# Altium footprint library HSD_connectors.PcbLib: 59 footprints (part 7 of 7)
Each footprint in its own frame and in the unit in brackets; x right, y up, seen from the top. Pads: shape width x height; smd on the part's side, far side on the other; paste and mask are expansions set on the pad; w line width, h text height; cw(c..) or ccw(c..) is an arc to the next point about the centre after c.
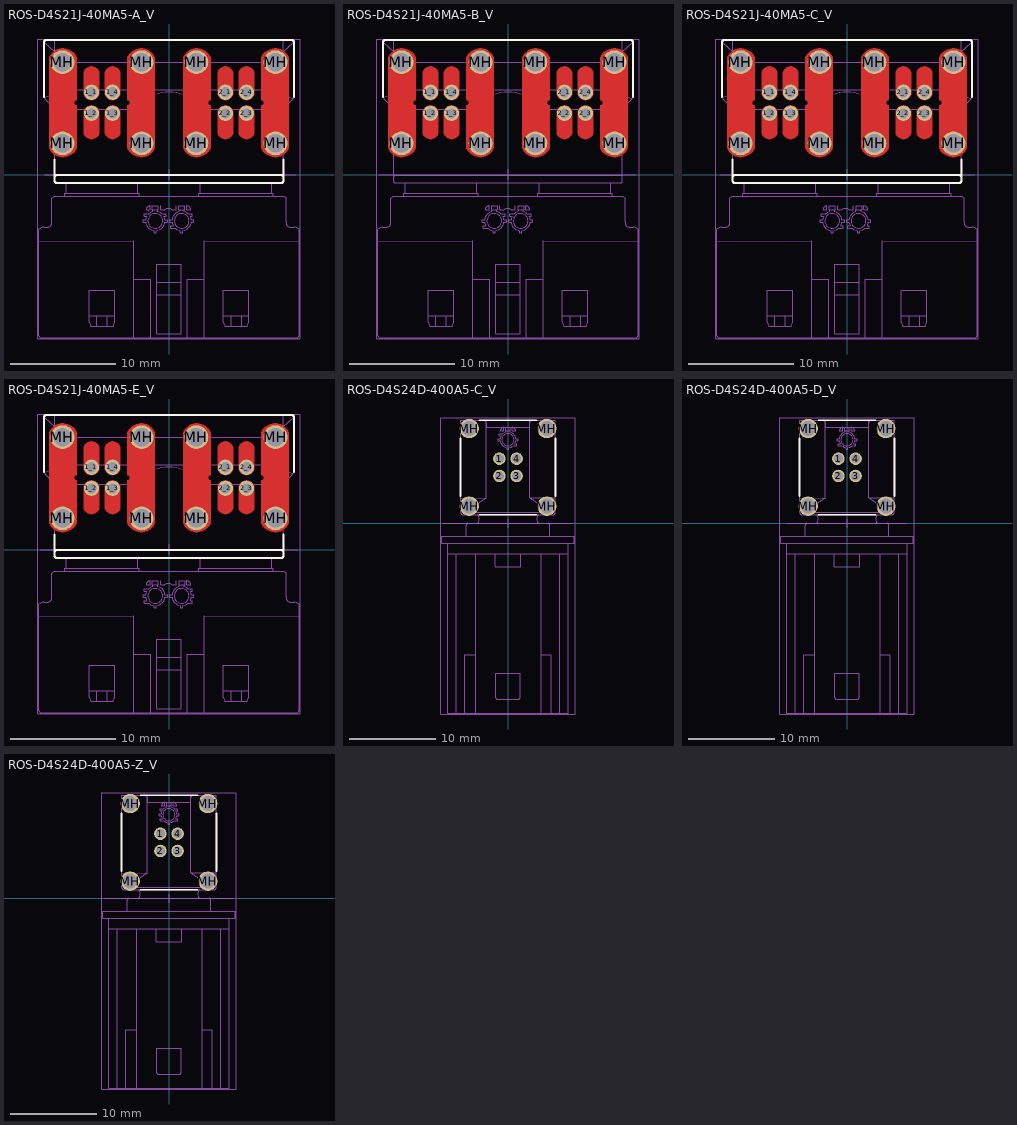
[diagram p6: the footprints below, top view; thin cyan lines are the x and y axes]

## ROS-D4S21J-40MA5-A_V [mm] "Dual HSD, Right Angle Plug, Edge Mount Pin in Paste, 28.25x24.7x7.95mm, Rosenberger Recommended"
height 7.95
pads (16):
  round 1.45 hole 0.95: 1_1(-7.35,7.81) 1_2(-7.35,5.81) 1_3(-5.35,5.81) 1_4(-5.35,7.81) 2_1(5.35,7.81) 2_2(5.35,5.81) 2_3(7.35,5.81) 2_4(7.35,7.81)
  round 2.25 hole 1.75: MH(-10.1,2.96) MH(-10.1,10.66) MH(-2.6,2.96) MH(-2.6,10.66) MH(2.6,2.96) MH(2.6,10.66) MH(10.1,2.96) MH(10.1,10.66)
Top Layer:
  region: -10.1,11.975 -9.995,11.975 -9.786,11.945 -9.584,11.887 -9.392,11.801 -9.214,11.689 -9.053,11.553 -8.913,11.396 -8.796,11.221 -8.75,11.126 -8.75,7.05 -8.797,7.045 -8.883,7.01 -8.95,6.943 -8.985,6.857 -8.99,6.81 -10.1,6.81
  region: -11.35,6.81 -10.1,6.81 -10.1,1.645 -10.2,1.649 -10.396,1.683 -10.586,1.745 -10.765,1.833 -10.93,1.945 -11.078,2.08 -11.205,2.233 -11.31,2.403 -11.35,2.494
  region: -10.1,1.645 -9.995,1.645 -9.786,1.675 -9.584,1.733 -9.392,1.819 -9.214,1.931 -9.053,2.067 -8.913,2.224 -8.796,2.399 -8.75,2.494 -8.75,6.57 -8.797,6.575 -8.883,6.61 -8.95,6.677 -8.985,6.763 -8.99,6.81 -10.1,6.81
  region: -8.1,4.11 -8.1,4.036 -8.071,3.891 -8.015,3.755 -7.933,3.632 -7.828,3.527 -7.705,3.445 -7.569,3.389 -7.424,3.36 -7.35,3.36 -7.35,6.56 -7.424,6.56 -7.569,6.531 -7.705,6.475 -7.828,6.393 -7.933,6.288 -8.015,6.165 -8.071,6.029 -8.1,5.884 -8.1,5.81
  region: -11.35,6.81 -10.1,6.81 -10.1,11.975 -10.2,11.971 -10.396,11.937 -10.586,11.875 -10.765,11.787 -10.93,11.675 -11.078,11.54 -11.205,11.387 -11.31,11.217 -11.35,11.126
  region: -6.6,4.11 -6.6,4.036 -6.629,3.891 -6.685,3.755 -6.767,3.632 -6.872,3.527 -6.995,3.445 -7.131,3.389 -7.276,3.36 -7.35,3.36 -7.35,6.56 -7.276,6.56 -7.131,6.531 -6.995,6.475 -6.872,6.393 -6.767,6.288 -6.685,6.165 -6.629,6.029 -6.6,5.884 -6.6,5.81
  region: -6.6,9.51 -6.6,9.584 -6.629,9.729 -6.685,9.865 -6.767,9.988 -6.872,10.093 -6.995,10.175 -7.131,10.231 -7.276,10.26 -7.35,10.26 -7.35,7.06 -7.276,7.06 -7.131,7.089 -6.995,7.145 -6.872,7.227 -6.767,7.332 -6.685,7.455 -6.629,7.591 -6.6,7.736 -6.6,7.81
  region: -8.1,9.51 -8.1,9.584 -8.071,9.729 -8.015,9.865 -7.933,9.988 -7.828,10.093 -7.705,10.175 -7.569,10.231 -7.424,10.26 -7.35,10.26 -7.35,7.06 -7.424,7.06 -7.569,7.089 -7.705,7.145 -7.828,7.227 -7.933,7.332 -8.015,7.455 -8.071,7.591 -8.1,7.736 -8.1,7.81
  region: -6.1,9.51 -6.1,9.584 -6.071,9.729 -6.015,9.865 -5.933,9.988 -5.828,10.093 -5.705,10.175 -5.569,10.231 -5.424,10.26 -5.35,10.26 -5.35,7.06 -5.424,7.06 -5.569,7.089 -5.705,7.145 -5.828,7.227 -5.933,7.332 -6.015,7.455 -6.071,7.591 -6.1,7.736 -6.1,7.81
  region: -4.6,9.51 -4.6,9.584 -4.629,9.729 -4.685,9.865 -4.767,9.988 -4.872,10.093 -4.995,10.175 -5.131,10.231 -5.276,10.26 -5.35,10.26 -5.35,7.06 -5.276,7.06 -5.131,7.089 -4.995,7.145 -4.872,7.227 -4.767,7.332 -4.685,7.455 -4.629,7.591 -4.6,7.736 -4.6,7.81
  region: -6.1,4.11 -6.1,4.036 -6.071,3.891 -6.015,3.755 -5.933,3.632 -5.828,3.527 -5.705,3.445 -5.569,3.389 -5.424,3.36 -5.35,3.36 -5.35,6.56 -5.424,6.56 -5.569,6.531 -5.705,6.475 -5.828,6.393 -5.933,6.288 -6.015,6.165 -6.071,6.029 -6.1,5.884 -6.1,5.81
  region: -4.6,4.11 -4.6,4.036 -4.629,3.891 -4.685,3.755 -4.767,3.632 -4.872,3.527 -4.995,3.445 -5.131,3.389 -5.276,3.36 -5.35,3.36 -5.35,6.56 -5.276,6.56 -5.131,6.531 -4.995,6.475 -4.872,6.393 -4.767,6.288 -4.685,6.165 -4.629,6.029 -4.6,5.884 -4.6,5.81
  region: -1.35,6.81 -2.6,6.81 -2.6,11.975 -2.5,11.971 -2.304,11.937 -2.114,11.875 -1.935,11.787 -1.77,11.675 -1.622,11.54 -1.495,11.387 -1.39,11.217 -1.35,11.126
  region: -2.6,1.645 -2.705,1.645 -2.914,1.675 -3.116,1.733 -3.308,1.819 -3.486,1.931 -3.647,2.067 -3.787,2.224 -3.904,2.399 -3.95,2.494 -3.95,6.57 -3.903,6.575 -3.817,6.61 -3.75,6.677 -3.715,6.763 -3.71,6.81 -2.6,6.81
  region: -1.35,6.81 -2.6,6.81 -2.6,1.645 -2.5,1.649 -2.304,1.683 -2.114,1.745 -1.935,1.833 -1.77,1.945 -1.622,2.08 -1.495,2.233 -1.39,2.403 -1.35,2.494
  region: -2.6,11.975 -2.705,11.975 -2.914,11.945 -3.116,11.887 -3.308,11.801 -3.486,11.689 -3.647,11.553 -3.787,11.396 -3.904,11.221 -3.95,11.126 -3.95,7.05 -3.903,7.045 -3.817,7.01 -3.75,6.943 -3.715,6.857 -3.71,6.81 -2.6,6.81
  region: 2.6,11.975 2.705,11.975 2.914,11.945 3.116,11.887 3.308,11.801 3.486,11.689 3.647,11.553 3.787,11.396 3.904,11.221 3.95,11.126 3.95,7.05 3.903,7.045 3.817,7.01 3.75,6.943 3.715,6.857 3.71,6.81 2.6,6.81
  region: 1.35,6.81 2.6,6.81 2.6,1.645 2.5,1.649 2.304,1.683 2.114,1.745 1.935,1.833 1.77,1.945 1.622,2.08 1.495,2.233 1.39,2.403 1.35,2.494
  region: 2.6,1.645 2.705,1.645 2.914,1.675 3.116,1.733 3.308,1.819 3.486,1.931 3.647,2.067 3.787,2.224 3.904,2.399 3.95,2.494 3.95,6.57 3.903,6.575 3.817,6.61 3.75,6.677 3.715,6.763 3.71,6.81 2.6,6.81
  region: 1.35,6.81 2.6,6.81 2.6,11.975 2.5,11.971 2.304,11.937 2.114,11.875 1.935,11.787 1.77,11.675 1.622,11.54 1.495,11.387 1.39,11.217 1.35,11.126
  region: 4.6,4.11 4.6,4.036 4.629,3.891 4.685,3.755 4.767,3.632 4.872,3.527 4.995,3.445 5.131,3.389 5.276,3.36 5.35,3.36 5.35,6.56 5.276,6.56 5.131,6.531 4.995,6.475 4.872,6.393 4.767,6.288 4.685,6.165 4.629,6.029 4.6,5.884 4.6,5.81
  region: 6.1,4.11 6.1,4.036 6.071,3.891 6.015,3.755 5.933,3.632 5.828,3.527 5.705,3.445 5.569,3.389 5.424,3.36 5.35,3.36 5.35,6.56 5.424,6.56 5.569,6.531 5.705,6.475 5.828,6.393 5.933,6.288 6.015,6.165 6.071,6.029 6.1,5.884 6.1,5.81
  region: 4.6,9.51 4.6,9.584 4.629,9.729 4.685,9.865 4.767,9.988 4.872,10.093 4.995,10.175 5.131,10.231 5.276,10.26 5.35,10.26 5.35,7.06 5.276,7.06 5.131,7.089 4.995,7.145 4.872,7.227 4.767,7.332 4.685,7.455 4.629,7.591 4.6,7.736 4.6,7.81
  region: 6.1,9.51 6.1,9.584 6.071,9.729 6.015,9.865 5.933,9.988 5.828,10.093 5.705,10.175 5.569,10.231 5.424,10.26 5.35,10.26 5.35,7.06 5.424,7.06 5.569,7.089 5.705,7.145 5.828,7.227 5.933,7.332 6.015,7.455 6.071,7.591 6.1,7.736 6.1,7.81
  region: 8.1,9.51 8.1,9.584 8.071,9.729 8.015,9.865 7.933,9.988 7.828,10.093 7.705,10.175 7.569,10.231 7.424,10.26 7.35,10.26 7.35,7.06 7.424,7.06 7.569,7.089 7.705,7.145 7.828,7.227 7.933,7.332 8.015,7.455 8.071,7.591 8.1,7.736 8.1,7.81
  region: 6.6,9.51 6.6,9.584 6.629,9.729 6.685,9.865 6.767,9.988 6.872,10.093 6.995,10.175 7.131,10.231 7.276,10.26 7.35,10.26 7.35,7.06 7.276,7.06 7.131,7.089 6.995,7.145 6.872,7.227 6.767,7.332 6.685,7.455 6.629,7.591 6.6,7.736 6.6,7.81
  region: 6.6,4.11 6.6,4.036 6.629,3.891 6.685,3.755 6.767,3.632 6.872,3.527 6.995,3.445 7.131,3.389 7.276,3.36 7.35,3.36 7.35,6.56 7.276,6.56 7.131,6.531 6.995,6.475 6.872,6.393 6.767,6.288 6.685,6.165 6.629,6.029 6.6,5.884 6.6,5.81
  region: 11.35,6.81 10.1,6.81 10.1,11.975 10.2,11.971 10.396,11.937 10.586,11.875 10.765,11.787 10.93,11.675 11.078,11.54 11.205,11.387 11.31,11.217 11.35,11.126
  region: 8.1,4.11 8.1,4.036 8.071,3.891 8.015,3.755 7.933,3.632 7.828,3.527 7.705,3.445 7.569,3.389 7.424,3.36 7.35,3.36 7.35,6.56 7.424,6.56 7.569,6.531 7.705,6.475 7.828,6.393 7.933,6.288 8.015,6.165 8.071,6.029 8.1,5.884 8.1,5.81
  region: 10.1,1.645 9.995,1.645 9.786,1.675 9.584,1.733 9.392,1.819 9.214,1.931 9.053,2.067 8.913,2.224 8.796,2.399 8.75,2.494 8.75,6.57 8.797,6.575 8.883,6.61 8.95,6.677 8.985,6.763 8.99,6.81 10.1,6.81
  region: 11.35,6.81 10.1,6.81 10.1,1.645 10.2,1.649 10.396,1.683 10.586,1.745 10.765,1.833 10.93,1.945 11.078,2.08 11.205,2.233 11.31,2.403 11.35,2.494
  region: 10.1,11.975 9.995,11.975 9.786,11.945 9.584,11.887 9.392,11.801 9.214,11.689 9.053,11.553 8.913,11.396 8.796,11.221 8.75,11.126 8.75,7.05 8.797,7.045 8.883,7.01 8.95,6.943 8.985,6.857 8.99,6.81 10.1,6.81
Top Overlay:
  lines w0.2: -11.85,7.343 -11.85,12.56 cw(c-11.65,12.56) -11.65,12.76 -10.85,12.76 10.85,12.76 11.65,12.76 cw(c11.65,12.56) 11.85,12.56 11.85,7.343 ; -10.85,1.426 -10.85,-0.24 ; 10.85,1.426 10.85,-0.24 ; -10.85,-0.24 cw(c-10.65,-0.24) -10.65,-0.04 10.65,-0.04 cw(c10.65,-0.24) 10.85,-0.24 ; -10.85,-0.24 -10.85,-0.59 ccw(c-10.65,-0.59) -10.65,-0.79 10.65,-0.79 ccw(c10.65,-0.59) 10.85,-0.59 10.85,-0.24
Mechanical 3:
  lines w0.1: -11.8,0 12,0
  text "Board Edge" at -12.2,-0.5 h0.2
Mechanical 13:
  drawing of 192 lines, arcs and shapes, not listed
  text ".Designator" at -2.02,0.17 h2.69
Mechanical 15:
  lines w0.05: -12.45,-15.59 12.45,-15.59 12.45,12.86 -12.45,12.86 -12.45,-15.59
  lines w0.1: -0.5,0 0.5,0 ; 0,-0.5 0,0.5
3D body "d4s21j-40mA5-A.stp": height 11, standoff -3.2, extent -12.35,-15.49 12.35,12.76

## ROS-D4S21J-40MA5-B_V [mm] "Dual HSD, Right Angle Plug, Edge Mount Pin in Paste, 28.25x24.7x7.95mm, Rosenberger Recommended"
height 7.95
pads (16):
  round 1.45 hole 0.95: 1_1(-7.35,7.81) 1_2(-7.35,5.81) 1_3(-5.35,5.81) 1_4(-5.35,7.81) 2_1(5.35,7.81) 2_2(5.35,5.81) 2_3(7.35,5.81) 2_4(7.35,7.81)
  round 2.25 hole 1.75: MH(-10.1,2.96) MH(-10.1,10.66) MH(-2.6,2.96) MH(-2.6,10.66) MH(2.6,2.96) MH(2.6,10.66) MH(10.1,2.96) MH(10.1,10.66)
Top Layer:
  region: 10.1,11.975 9.995,11.975 9.786,11.945 9.584,11.887 9.392,11.801 9.214,11.689 9.053,11.553 8.913,11.396 8.796,11.221 8.75,11.126 8.75,7.05 8.797,7.045 8.883,7.01 8.95,6.943 8.985,6.857 8.99,6.81 10.1,6.81
  region: 11.35,6.81 10.1,6.81 10.1,1.645 10.2,1.649 10.396,1.683 10.586,1.745 10.765,1.833 10.93,1.945 11.078,2.08 11.205,2.233 11.31,2.403 11.35,2.494
  region: 10.1,1.645 9.995,1.645 9.786,1.675 9.584,1.733 9.392,1.819 9.214,1.931 9.053,2.067 8.913,2.224 8.796,2.399 8.75,2.494 8.75,6.57 8.797,6.575 8.883,6.61 8.95,6.677 8.985,6.763 8.99,6.81 10.1,6.81
  region: 8.1,4.11 8.1,4.036 8.071,3.891 8.015,3.755 7.933,3.632 7.828,3.527 7.705,3.445 7.569,3.389 7.424,3.36 7.35,3.36 7.35,6.56 7.424,6.56 7.569,6.531 7.705,6.475 7.828,6.393 7.933,6.288 8.015,6.165 8.071,6.029 8.1,5.884 8.1,5.81
  region: 11.35,6.81 10.1,6.81 10.1,11.975 10.2,11.971 10.396,11.937 10.586,11.875 10.765,11.787 10.93,11.675 11.078,11.54 11.205,11.387 11.31,11.217 11.35,11.126
  region: 6.6,4.11 6.6,4.036 6.629,3.891 6.685,3.755 6.767,3.632 6.872,3.527 6.995,3.445 7.131,3.389 7.276,3.36 7.35,3.36 7.35,6.56 7.276,6.56 7.131,6.531 6.995,6.475 6.872,6.393 6.767,6.288 6.685,6.165 6.629,6.029 6.6,5.884 6.6,5.81
  region: 6.6,9.51 6.6,9.584 6.629,9.729 6.685,9.865 6.767,9.988 6.872,10.093 6.995,10.175 7.131,10.231 7.276,10.26 7.35,10.26 7.35,7.06 7.276,7.06 7.131,7.089 6.995,7.145 6.872,7.227 6.767,7.332 6.685,7.455 6.629,7.591 6.6,7.736 6.6,7.81
  region: 8.1,9.51 8.1,9.584 8.071,9.729 8.015,9.865 7.933,9.988 7.828,10.093 7.705,10.175 7.569,10.231 7.424,10.26 7.35,10.26 7.35,7.06 7.424,7.06 7.569,7.089 7.705,7.145 7.828,7.227 7.933,7.332 8.015,7.455 8.071,7.591 8.1,7.736 8.1,7.81
  region: 6.1,9.51 6.1,9.584 6.071,9.729 6.015,9.865 5.933,9.988 5.828,10.093 5.705,10.175 5.569,10.231 5.424,10.26 5.35,10.26 5.35,7.06 5.424,7.06 5.569,7.089 5.705,7.145 5.828,7.227 5.933,7.332 6.015,7.455 6.071,7.591 6.1,7.736 6.1,7.81
  region: 4.6,9.51 4.6,9.584 4.629,9.729 4.685,9.865 4.767,9.988 4.872,10.093 4.995,10.175 5.131,10.231 5.276,10.26 5.35,10.26 5.35,7.06 5.276,7.06 5.131,7.089 4.995,7.145 4.872,7.227 4.767,7.332 4.685,7.455 4.629,7.591 4.6,7.736 4.6,7.81
  region: 6.1,4.11 6.1,4.036 6.071,3.891 6.015,3.755 5.933,3.632 5.828,3.527 5.705,3.445 5.569,3.389 5.424,3.36 5.35,3.36 5.35,6.56 5.424,6.56 5.569,6.531 5.705,6.475 5.828,6.393 5.933,6.288 6.015,6.165 6.071,6.029 6.1,5.884 6.1,5.81
  region: 4.6,4.11 4.6,4.036 4.629,3.891 4.685,3.755 4.767,3.632 4.872,3.527 4.995,3.445 5.131,3.389 5.276,3.36 5.35,3.36 5.35,6.56 5.276,6.56 5.131,6.531 4.995,6.475 4.872,6.393 4.767,6.288 4.685,6.165 4.629,6.029 4.6,5.884 4.6,5.81
  region: 1.35,6.81 2.6,6.81 2.6,11.975 2.5,11.971 2.304,11.937 2.114,11.875 1.935,11.787 1.77,11.675 1.622,11.54 1.495,11.387 1.39,11.217 1.35,11.126
  region: 2.6,1.645 2.705,1.645 2.914,1.675 3.116,1.733 3.308,1.819 3.486,1.931 3.647,2.067 3.787,2.224 3.904,2.399 3.95,2.494 3.95,6.57 3.903,6.575 3.817,6.61 3.75,6.677 3.715,6.763 3.71,6.81 2.6,6.81
  region: 1.35,6.81 2.6,6.81 2.6,1.645 2.5,1.649 2.304,1.683 2.114,1.745 1.935,1.833 1.77,1.945 1.622,2.08 1.495,2.233 1.39,2.403 1.35,2.494
  region: 2.6,11.975 2.705,11.975 2.914,11.945 3.116,11.887 3.308,11.801 3.486,11.689 3.647,11.553 3.787,11.396 3.904,11.221 3.95,11.126 3.95,7.05 3.903,7.045 3.817,7.01 3.75,6.943 3.715,6.857 3.71,6.81 2.6,6.81
  region: -2.6,11.975 -2.705,11.975 -2.914,11.945 -3.116,11.887 -3.308,11.801 -3.486,11.689 -3.647,11.553 -3.787,11.396 -3.904,11.221 -3.95,11.126 -3.95,7.05 -3.903,7.045 -3.817,7.01 -3.75,6.943 -3.715,6.857 -3.71,6.81 -2.6,6.81
  region: -1.35,6.81 -2.6,6.81 -2.6,1.645 -2.5,1.649 -2.304,1.683 -2.114,1.745 -1.935,1.833 -1.77,1.945 -1.622,2.08 -1.495,2.233 -1.39,2.403 -1.35,2.494
  region: -2.6,1.645 -2.705,1.645 -2.914,1.675 -3.116,1.733 -3.308,1.819 -3.486,1.931 -3.647,2.067 -3.787,2.224 -3.904,2.399 -3.95,2.494 -3.95,6.57 -3.903,6.575 -3.817,6.61 -3.75,6.677 -3.715,6.763 -3.71,6.81 -2.6,6.81
  region: -1.35,6.81 -2.6,6.81 -2.6,11.975 -2.5,11.971 -2.304,11.937 -2.114,11.875 -1.935,11.787 -1.77,11.675 -1.622,11.54 -1.495,11.387 -1.39,11.217 -1.35,11.126
  region: -4.6,4.11 -4.6,4.036 -4.629,3.891 -4.685,3.755 -4.767,3.632 -4.872,3.527 -4.995,3.445 -5.131,3.389 -5.276,3.36 -5.35,3.36 -5.35,6.56 -5.276,6.56 -5.131,6.531 -4.995,6.475 -4.872,6.393 -4.767,6.288 -4.685,6.165 -4.629,6.029 -4.6,5.884 -4.6,5.81
  region: -6.1,4.11 -6.1,4.036 -6.071,3.891 -6.015,3.755 -5.933,3.632 -5.828,3.527 -5.705,3.445 -5.569,3.389 -5.424,3.36 -5.35,3.36 -5.35,6.56 -5.424,6.56 -5.569,6.531 -5.705,6.475 -5.828,6.393 -5.933,6.288 -6.015,6.165 -6.071,6.029 -6.1,5.884 -6.1,5.81
  region: -4.6,9.51 -4.6,9.584 -4.629,9.729 -4.685,9.865 -4.767,9.988 -4.872,10.093 -4.995,10.175 -5.131,10.231 -5.276,10.26 -5.35,10.26 -5.35,7.06 -5.276,7.06 -5.131,7.089 -4.995,7.145 -4.872,7.227 -4.767,7.332 -4.685,7.455 -4.629,7.591 -4.6,7.736 -4.6,7.81
  region: -6.1,9.51 -6.1,9.584 -6.071,9.729 -6.015,9.865 -5.933,9.988 -5.828,10.093 -5.705,10.175 -5.569,10.231 -5.424,10.26 -5.35,10.26 -5.35,7.06 -5.424,7.06 -5.569,7.089 -5.705,7.145 -5.828,7.227 -5.933,7.332 -6.015,7.455 -6.071,7.591 -6.1,7.736 -6.1,7.81
  region: -8.1,9.51 -8.1,9.584 -8.071,9.729 -8.015,9.865 -7.933,9.988 -7.828,10.093 -7.705,10.175 -7.569,10.231 -7.424,10.26 -7.35,10.26 -7.35,7.06 -7.424,7.06 -7.569,7.089 -7.705,7.145 -7.828,7.227 -7.933,7.332 -8.015,7.455 -8.071,7.591 -8.1,7.736 -8.1,7.81
  region: -6.6,9.51 -6.6,9.584 -6.629,9.729 -6.685,9.865 -6.767,9.988 -6.872,10.093 -6.995,10.175 -7.131,10.231 -7.276,10.26 -7.35,10.26 -7.35,7.06 -7.276,7.06 -7.131,7.089 -6.995,7.145 -6.872,7.227 -6.767,7.332 -6.685,7.455 -6.629,7.591 -6.6,7.736 -6.6,7.81
  region: -6.6,4.11 -6.6,4.036 -6.629,3.891 -6.685,3.755 -6.767,3.632 -6.872,3.527 -6.995,3.445 -7.131,3.389 -7.276,3.36 -7.35,3.36 -7.35,6.56 -7.276,6.56 -7.131,6.531 -6.995,6.475 -6.872,6.393 -6.767,6.288 -6.685,6.165 -6.629,6.029 -6.6,5.884 -6.6,5.81
  region: -11.35,6.81 -10.1,6.81 -10.1,11.975 -10.2,11.971 -10.396,11.937 -10.586,11.875 -10.765,11.787 -10.93,11.675 -11.078,11.54 -11.205,11.387 -11.31,11.217 -11.35,11.126
  region: -8.1,4.11 -8.1,4.036 -8.071,3.891 -8.015,3.755 -7.933,3.632 -7.828,3.527 -7.705,3.445 -7.569,3.389 -7.424,3.36 -7.35,3.36 -7.35,6.56 -7.424,6.56 -7.569,6.531 -7.705,6.475 -7.828,6.393 -7.933,6.288 -8.015,6.165 -8.071,6.029 -8.1,5.884 -8.1,5.81
  region: -10.1,1.645 -9.995,1.645 -9.786,1.675 -9.584,1.733 -9.392,1.819 -9.214,1.931 -9.053,2.067 -8.913,2.224 -8.796,2.399 -8.75,2.494 -8.75,6.57 -8.797,6.575 -8.883,6.61 -8.95,6.677 -8.985,6.763 -8.99,6.81 -10.1,6.81
  region: -11.35,6.81 -10.1,6.81 -10.1,1.645 -10.2,1.649 -10.396,1.683 -10.586,1.745 -10.765,1.833 -10.93,1.945 -11.078,2.08 -11.205,2.233 -11.31,2.403 -11.35,2.494
  region: -10.1,11.975 -9.995,11.975 -9.786,11.945 -9.584,11.887 -9.392,11.801 -9.214,11.689 -9.053,11.553 -8.913,11.396 -8.796,11.221 -8.75,11.126 -8.75,7.05 -8.797,7.045 -8.883,7.01 -8.95,6.943 -8.985,6.857 -8.99,6.81 -10.1,6.81
Top Overlay:
  lines w0.2: -11.85,7.343 -11.85,12.56 cw(c-11.65,12.56) -11.65,12.76 -10.85,12.76 10.85,12.76 11.65,12.76 cw(c11.65,12.56) 11.85,12.56 11.85,7.343
Mechanical 3:
  lines w0.1: -12.2,0 12.1,0
  text "Board Edge" at -12.2,-0.7 h0.2
Mechanical 13:
  drawing of 192 lines, arcs and shapes, not listed
  text ".Designator" at -2.02,0.17 h2.69
Mechanical 15:
  lines w0.05: -12.45,-15.59 12.45,-15.59 12.45,12.86 -12.45,12.86 -12.45,-15.59
  lines w0.1: -0.5,0 0.5,0 ; 0,-0.5 0,0.5
3D body "d4s21j-40mA5-B.stp": height 11, standoff -3.2, extent -12.35,-15.49 12.35,12.76

## ROS-D4S21J-40MA5-C_V [mm] "Dual HSD, Right Angle Plug, Edge Mount Pin in Paste, 28.25x24.7x7.95mm, Rosenberger Recommended"
height 7.95
pads (16):
  round 1.45 hole 0.95: 1_1(-7.35,7.81) 1_2(-7.35,5.81) 1_3(-5.35,5.81) 1_4(-5.35,7.81) 2_1(5.35,7.81) 2_2(5.35,5.81) 2_3(7.35,5.81) 2_4(7.35,7.81)
  round 2.25 hole 1.75: MH(-10.1,2.96) MH(-10.1,10.66) MH(-2.6,2.96) MH(-2.6,10.66) MH(2.6,2.96) MH(2.6,10.66) MH(10.1,2.96) MH(10.1,10.66)
Top Layer:
  region: 10.1,11.975 9.995,11.975 9.786,11.945 9.584,11.887 9.392,11.801 9.214,11.689 9.053,11.553 8.913,11.396 8.796,11.221 8.75,11.126 8.75,7.05 8.797,7.045 8.883,7.01 8.95,6.943 8.985,6.857 8.99,6.81 10.1,6.81
  region: 11.35,6.81 10.1,6.81 10.1,1.645 10.2,1.649 10.396,1.683 10.586,1.745 10.765,1.833 10.93,1.945 11.078,2.08 11.205,2.233 11.31,2.403 11.35,2.494
  region: 10.1,1.645 9.995,1.645 9.786,1.675 9.584,1.733 9.392,1.819 9.214,1.931 9.053,2.067 8.913,2.224 8.796,2.399 8.75,2.494 8.75,6.57 8.797,6.575 8.883,6.61 8.95,6.677 8.985,6.763 8.99,6.81 10.1,6.81
  region: 8.1,4.11 8.1,4.036 8.071,3.891 8.015,3.755 7.933,3.632 7.828,3.527 7.705,3.445 7.569,3.389 7.424,3.36 7.35,3.36 7.35,6.56 7.424,6.56 7.569,6.531 7.705,6.475 7.828,6.393 7.933,6.288 8.015,6.165 8.071,6.029 8.1,5.884 8.1,5.81
  region: 11.35,6.81 10.1,6.81 10.1,11.975 10.2,11.971 10.396,11.937 10.586,11.875 10.765,11.787 10.93,11.675 11.078,11.54 11.205,11.387 11.31,11.217 11.35,11.126
  region: 6.6,4.11 6.6,4.036 6.629,3.891 6.685,3.755 6.767,3.632 6.872,3.527 6.995,3.445 7.131,3.389 7.276,3.36 7.35,3.36 7.35,6.56 7.276,6.56 7.131,6.531 6.995,6.475 6.872,6.393 6.767,6.288 6.685,6.165 6.629,6.029 6.6,5.884 6.6,5.81
  region: 6.6,9.51 6.6,9.584 6.629,9.729 6.685,9.865 6.767,9.988 6.872,10.093 6.995,10.175 7.131,10.231 7.276,10.26 7.35,10.26 7.35,7.06 7.276,7.06 7.131,7.089 6.995,7.145 6.872,7.227 6.767,7.332 6.685,7.455 6.629,7.591 6.6,7.736 6.6,7.81
  region: 8.1,9.51 8.1,9.584 8.071,9.729 8.015,9.865 7.933,9.988 7.828,10.093 7.705,10.175 7.569,10.231 7.424,10.26 7.35,10.26 7.35,7.06 7.424,7.06 7.569,7.089 7.705,7.145 7.828,7.227 7.933,7.332 8.015,7.455 8.071,7.591 8.1,7.736 8.1,7.81
  region: 6.1,9.51 6.1,9.584 6.071,9.729 6.015,9.865 5.933,9.988 5.828,10.093 5.705,10.175 5.569,10.231 5.424,10.26 5.35,10.26 5.35,7.06 5.424,7.06 5.569,7.089 5.705,7.145 5.828,7.227 5.933,7.332 6.015,7.455 6.071,7.591 6.1,7.736 6.1,7.81
  region: 4.6,9.51 4.6,9.584 4.629,9.729 4.685,9.865 4.767,9.988 4.872,10.093 4.995,10.175 5.131,10.231 5.276,10.26 5.35,10.26 5.35,7.06 5.276,7.06 5.131,7.089 4.995,7.145 4.872,7.227 4.767,7.332 4.685,7.455 4.629,7.591 4.6,7.736 4.6,7.81
  region: 6.1,4.11 6.1,4.036 6.071,3.891 6.015,3.755 5.933,3.632 5.828,3.527 5.705,3.445 5.569,3.389 5.424,3.36 5.35,3.36 5.35,6.56 5.424,6.56 5.569,6.531 5.705,6.475 5.828,6.393 5.933,6.288 6.015,6.165 6.071,6.029 6.1,5.884 6.1,5.81
  region: 4.6,4.11 4.6,4.036 4.629,3.891 4.685,3.755 4.767,3.632 4.872,3.527 4.995,3.445 5.131,3.389 5.276,3.36 5.35,3.36 5.35,6.56 5.276,6.56 5.131,6.531 4.995,6.475 4.872,6.393 4.767,6.288 4.685,6.165 4.629,6.029 4.6,5.884 4.6,5.81
  region: 1.35,6.81 2.6,6.81 2.6,11.975 2.5,11.971 2.304,11.937 2.114,11.875 1.935,11.787 1.77,11.675 1.622,11.54 1.495,11.387 1.39,11.217 1.35,11.126
  region: 2.6,1.645 2.705,1.645 2.914,1.675 3.116,1.733 3.308,1.819 3.486,1.931 3.647,2.067 3.787,2.224 3.904,2.399 3.95,2.494 3.95,6.57 3.903,6.575 3.817,6.61 3.75,6.677 3.715,6.763 3.71,6.81 2.6,6.81
  region: 1.35,6.81 2.6,6.81 2.6,1.645 2.5,1.649 2.304,1.683 2.114,1.745 1.935,1.833 1.77,1.945 1.622,2.08 1.495,2.233 1.39,2.403 1.35,2.494
  region: 2.6,11.975 2.705,11.975 2.914,11.945 3.116,11.887 3.308,11.801 3.486,11.689 3.647,11.553 3.787,11.396 3.904,11.221 3.95,11.126 3.95,7.05 3.903,7.045 3.817,7.01 3.75,6.943 3.715,6.857 3.71,6.81 2.6,6.81
  region: -2.6,11.975 -2.705,11.975 -2.914,11.945 -3.116,11.887 -3.308,11.801 -3.486,11.689 -3.647,11.553 -3.787,11.396 -3.904,11.221 -3.95,11.126 -3.95,7.05 -3.903,7.045 -3.817,7.01 -3.75,6.943 -3.715,6.857 -3.71,6.81 -2.6,6.81
  region: -1.35,6.81 -2.6,6.81 -2.6,1.645 -2.5,1.649 -2.304,1.683 -2.114,1.745 -1.935,1.833 -1.77,1.945 -1.622,2.08 -1.495,2.233 -1.39,2.403 -1.35,2.494
  region: -2.6,1.645 -2.705,1.645 -2.914,1.675 -3.116,1.733 -3.308,1.819 -3.486,1.931 -3.647,2.067 -3.787,2.224 -3.904,2.399 -3.95,2.494 -3.95,6.57 -3.903,6.575 -3.817,6.61 -3.75,6.677 -3.715,6.763 -3.71,6.81 -2.6,6.81
  region: -1.35,6.81 -2.6,6.81 -2.6,11.975 -2.5,11.971 -2.304,11.937 -2.114,11.875 -1.935,11.787 -1.77,11.675 -1.622,11.54 -1.495,11.387 -1.39,11.217 -1.35,11.126
  region: -4.6,4.11 -4.6,4.036 -4.629,3.891 -4.685,3.755 -4.767,3.632 -4.872,3.527 -4.995,3.445 -5.131,3.389 -5.276,3.36 -5.35,3.36 -5.35,6.56 -5.276,6.56 -5.131,6.531 -4.995,6.475 -4.872,6.393 -4.767,6.288 -4.685,6.165 -4.629,6.029 -4.6,5.884 -4.6,5.81
  region: -6.1,4.11 -6.1,4.036 -6.071,3.891 -6.015,3.755 -5.933,3.632 -5.828,3.527 -5.705,3.445 -5.569,3.389 -5.424,3.36 -5.35,3.36 -5.35,6.56 -5.424,6.56 -5.569,6.531 -5.705,6.475 -5.828,6.393 -5.933,6.288 -6.015,6.165 -6.071,6.029 -6.1,5.884 -6.1,5.81
  region: -4.6,9.51 -4.6,9.584 -4.629,9.729 -4.685,9.865 -4.767,9.988 -4.872,10.093 -4.995,10.175 -5.131,10.231 -5.276,10.26 -5.35,10.26 -5.35,7.06 -5.276,7.06 -5.131,7.089 -4.995,7.145 -4.872,7.227 -4.767,7.332 -4.685,7.455 -4.629,7.591 -4.6,7.736 -4.6,7.81
  region: -6.1,9.51 -6.1,9.584 -6.071,9.729 -6.015,9.865 -5.933,9.988 -5.828,10.093 -5.705,10.175 -5.569,10.231 -5.424,10.26 -5.35,10.26 -5.35,7.06 -5.424,7.06 -5.569,7.089 -5.705,7.145 -5.828,7.227 -5.933,7.332 -6.015,7.455 -6.071,7.591 -6.1,7.736 -6.1,7.81
  region: -8.1,9.51 -8.1,9.584 -8.071,9.729 -8.015,9.865 -7.933,9.988 -7.828,10.093 -7.705,10.175 -7.569,10.231 -7.424,10.26 -7.35,10.26 -7.35,7.06 -7.424,7.06 -7.569,7.089 -7.705,7.145 -7.828,7.227 -7.933,7.332 -8.015,7.455 -8.071,7.591 -8.1,7.736 -8.1,7.81
  region: -6.6,9.51 -6.6,9.584 -6.629,9.729 -6.685,9.865 -6.767,9.988 -6.872,10.093 -6.995,10.175 -7.131,10.231 -7.276,10.26 -7.35,10.26 -7.35,7.06 -7.276,7.06 -7.131,7.089 -6.995,7.145 -6.872,7.227 -6.767,7.332 -6.685,7.455 -6.629,7.591 -6.6,7.736 -6.6,7.81
  region: -6.6,4.11 -6.6,4.036 -6.629,3.891 -6.685,3.755 -6.767,3.632 -6.872,3.527 -6.995,3.445 -7.131,3.389 -7.276,3.36 -7.35,3.36 -7.35,6.56 -7.276,6.56 -7.131,6.531 -6.995,6.475 -6.872,6.393 -6.767,6.288 -6.685,6.165 -6.629,6.029 -6.6,5.884 -6.6,5.81
  region: -11.35,6.81 -10.1,6.81 -10.1,11.975 -10.2,11.971 -10.396,11.937 -10.586,11.875 -10.765,11.787 -10.93,11.675 -11.078,11.54 -11.205,11.387 -11.31,11.217 -11.35,11.126
  region: -8.1,4.11 -8.1,4.036 -8.071,3.891 -8.015,3.755 -7.933,3.632 -7.828,3.527 -7.705,3.445 -7.569,3.389 -7.424,3.36 -7.35,3.36 -7.35,6.56 -7.424,6.56 -7.569,6.531 -7.705,6.475 -7.828,6.393 -7.933,6.288 -8.015,6.165 -8.071,6.029 -8.1,5.884 -8.1,5.81
  region: -10.1,1.645 -9.995,1.645 -9.786,1.675 -9.584,1.733 -9.392,1.819 -9.214,1.931 -9.053,2.067 -8.913,2.224 -8.796,2.399 -8.75,2.494 -8.75,6.57 -8.797,6.575 -8.883,6.61 -8.95,6.677 -8.985,6.763 -8.99,6.81 -10.1,6.81
  region: -11.35,6.81 -10.1,6.81 -10.1,1.645 -10.2,1.649 -10.396,1.683 -10.586,1.745 -10.765,1.833 -10.93,1.945 -11.078,2.08 -11.205,2.233 -11.31,2.403 -11.35,2.494
  region: -10.1,11.975 -9.995,11.975 -9.786,11.945 -9.584,11.887 -9.392,11.801 -9.214,11.689 -9.053,11.553 -8.913,11.396 -8.796,11.221 -8.75,11.126 -8.75,7.05 -8.797,7.045 -8.883,7.01 -8.95,6.943 -8.985,6.857 -8.99,6.81 -10.1,6.81
Top Overlay:
  lines w0.2: -11.85,7.343 -11.85,12.56 cw(c-11.65,12.56) -11.65,12.76 -10.85,12.76 10.85,12.76 11.65,12.76 cw(c11.65,12.56) 11.85,12.56 11.85,7.343 ; -10.85,1.426 -10.85,-0.24 ; 10.85,1.426 10.85,-0.24 ; -10.85,-0.24 cw(c-10.65,-0.24) -10.65,-0.04 10.65,-0.04 cw(c10.65,-0.24) 10.85,-0.24 ; -10.85,-0.24 -10.85,-0.59 ccw(c-10.65,-0.59) -10.65,-0.79 10.65,-0.79 ccw(c10.65,-0.59) 10.85,-0.59 10.85,-0.24
Mechanical 3:
  lines w0.1: -12,0 12.1,0
  text "Board Edge" at -11.8,-0.7 h0.2
Mechanical 13:
  drawing of 191 lines, arcs and shapes, not listed
  text ".Designator" at -2.147,0.17 h2.69
Mechanical 15:
  lines w0.05: -12.45,-15.59 -12.45,12.86 12.45,12.86 12.45,-15.59 -12.45,-15.59
  lines w0.1: -0.5,0 0.5,0 ; 0,-0.5 0,0.5
3D body "d4s21j-40mA5-C.stp": height 11, standoff -3.2, extent -12.35,-15.49 12.35,12.76

## ROS-D4S21J-40MA5-E_V [mm] "Dual HSD, Right Angle Plug, Edge Mount Pin in Paste, 28.25x24.7x7.95mm, Rosenberger Recommended"
height 7.95
pads (16):
  round 1.45 hole 0.95: 1_1(-7.35,7.81) 1_2(-7.35,5.81) 1_3(-5.35,5.81) 1_4(-5.35,7.81) 2_1(5.35,7.81) 2_2(5.35,5.81) 2_3(7.35,5.81) 2_4(7.35,7.81)
  round 2.25 hole 1.75: MH(-10.1,2.96) MH(-10.1,10.66) MH(-2.6,2.96) MH(-2.6,10.66) MH(2.6,2.96) MH(2.6,10.66) MH(10.1,2.96) MH(10.1,10.66)
Top Layer:
  region: 10.1,11.975 9.995,11.975 9.786,11.945 9.584,11.887 9.392,11.801 9.214,11.689 9.053,11.553 8.913,11.396 8.796,11.221 8.75,11.126 8.75,7.05 8.797,7.045 8.883,7.01 8.95,6.943 8.985,6.857 8.99,6.81 10.1,6.81
  region: 11.35,6.81 10.1,6.81 10.1,1.645 10.2,1.649 10.396,1.683 10.586,1.745 10.765,1.833 10.93,1.945 11.078,2.08 11.205,2.233 11.31,2.403 11.35,2.494
  region: 10.1,1.645 9.995,1.645 9.786,1.675 9.584,1.733 9.392,1.819 9.214,1.931 9.053,2.067 8.913,2.224 8.796,2.399 8.75,2.494 8.75,6.57 8.797,6.575 8.883,6.61 8.95,6.677 8.985,6.763 8.99,6.81 10.1,6.81
  region: 8.1,4.11 8.1,4.036 8.071,3.891 8.015,3.755 7.933,3.632 7.828,3.527 7.705,3.445 7.569,3.389 7.424,3.36 7.35,3.36 7.35,6.56 7.424,6.56 7.569,6.531 7.705,6.475 7.828,6.393 7.933,6.288 8.015,6.165 8.071,6.029 8.1,5.884 8.1,5.81
  region: 11.35,6.81 10.1,6.81 10.1,11.975 10.2,11.971 10.396,11.937 10.586,11.875 10.765,11.787 10.93,11.675 11.078,11.54 11.205,11.387 11.31,11.217 11.35,11.126
  region: 6.6,4.11 6.6,4.036 6.629,3.891 6.685,3.755 6.767,3.632 6.872,3.527 6.995,3.445 7.131,3.389 7.276,3.36 7.35,3.36 7.35,6.56 7.276,6.56 7.131,6.531 6.995,6.475 6.872,6.393 6.767,6.288 6.685,6.165 6.629,6.029 6.6,5.884 6.6,5.81
  region: 6.6,9.51 6.6,9.584 6.629,9.729 6.685,9.865 6.767,9.988 6.872,10.093 6.995,10.175 7.131,10.231 7.276,10.26 7.35,10.26 7.35,7.06 7.276,7.06 7.131,7.089 6.995,7.145 6.872,7.227 6.767,7.332 6.685,7.455 6.629,7.591 6.6,7.736 6.6,7.81
  region: 8.1,9.51 8.1,9.584 8.071,9.729 8.015,9.865 7.933,9.988 7.828,10.093 7.705,10.175 7.569,10.231 7.424,10.26 7.35,10.26 7.35,7.06 7.424,7.06 7.569,7.089 7.705,7.145 7.828,7.227 7.933,7.332 8.015,7.455 8.071,7.591 8.1,7.736 8.1,7.81
  region: 6.1,9.51 6.1,9.584 6.071,9.729 6.015,9.865 5.933,9.988 5.828,10.093 5.705,10.175 5.569,10.231 5.424,10.26 5.35,10.26 5.35,7.06 5.424,7.06 5.569,7.089 5.705,7.145 5.828,7.227 5.933,7.332 6.015,7.455 6.071,7.591 6.1,7.736 6.1,7.81
  region: 4.6,9.51 4.6,9.584 4.629,9.729 4.685,9.865 4.767,9.988 4.872,10.093 4.995,10.175 5.131,10.231 5.276,10.26 5.35,10.26 5.35,7.06 5.276,7.06 5.131,7.089 4.995,7.145 4.872,7.227 4.767,7.332 4.685,7.455 4.629,7.591 4.6,7.736 4.6,7.81
  region: 6.1,4.11 6.1,4.036 6.071,3.891 6.015,3.755 5.933,3.632 5.828,3.527 5.705,3.445 5.569,3.389 5.424,3.36 5.35,3.36 5.35,6.56 5.424,6.56 5.569,6.531 5.705,6.475 5.828,6.393 5.933,6.288 6.015,6.165 6.071,6.029 6.1,5.884 6.1,5.81
  region: 4.6,4.11 4.6,4.036 4.629,3.891 4.685,3.755 4.767,3.632 4.872,3.527 4.995,3.445 5.131,3.389 5.276,3.36 5.35,3.36 5.35,6.56 5.276,6.56 5.131,6.531 4.995,6.475 4.872,6.393 4.767,6.288 4.685,6.165 4.629,6.029 4.6,5.884 4.6,5.81
  region: 1.35,6.81 2.6,6.81 2.6,11.975 2.5,11.971 2.304,11.937 2.114,11.875 1.935,11.787 1.77,11.675 1.622,11.54 1.495,11.387 1.39,11.217 1.35,11.126
  region: 2.6,1.645 2.705,1.645 2.914,1.675 3.116,1.733 3.308,1.819 3.486,1.931 3.647,2.067 3.787,2.224 3.904,2.399 3.95,2.494 3.95,6.57 3.903,6.575 3.817,6.61 3.75,6.677 3.715,6.763 3.71,6.81 2.6,6.81
  region: 1.35,6.81 2.6,6.81 2.6,1.645 2.5,1.649 2.304,1.683 2.114,1.745 1.935,1.833 1.77,1.945 1.622,2.08 1.495,2.233 1.39,2.403 1.35,2.494
  region: 2.6,11.975 2.705,11.975 2.914,11.945 3.116,11.887 3.308,11.801 3.486,11.689 3.647,11.553 3.787,11.396 3.904,11.221 3.95,11.126 3.95,7.05 3.903,7.045 3.817,7.01 3.75,6.943 3.715,6.857 3.71,6.81 2.6,6.81
  region: -2.6,11.975 -2.705,11.975 -2.914,11.945 -3.116,11.887 -3.308,11.801 -3.486,11.689 -3.647,11.553 -3.787,11.396 -3.904,11.221 -3.95,11.126 -3.95,7.05 -3.903,7.045 -3.817,7.01 -3.75,6.943 -3.715,6.857 -3.71,6.81 -2.6,6.81
  region: -1.35,6.81 -2.6,6.81 -2.6,1.645 -2.5,1.649 -2.304,1.683 -2.114,1.745 -1.935,1.833 -1.77,1.945 -1.622,2.08 -1.495,2.233 -1.39,2.403 -1.35,2.494
  region: -2.6,1.645 -2.705,1.645 -2.914,1.675 -3.116,1.733 -3.308,1.819 -3.486,1.931 -3.647,2.067 -3.787,2.224 -3.904,2.399 -3.95,2.494 -3.95,6.57 -3.903,6.575 -3.817,6.61 -3.75,6.677 -3.715,6.763 -3.71,6.81 -2.6,6.81
  region: -1.35,6.81 -2.6,6.81 -2.6,11.975 -2.5,11.971 -2.304,11.937 -2.114,11.875 -1.935,11.787 -1.77,11.675 -1.622,11.54 -1.495,11.387 -1.39,11.217 -1.35,11.126
  region: -4.6,4.11 -4.6,4.036 -4.629,3.891 -4.685,3.755 -4.767,3.632 -4.872,3.527 -4.995,3.445 -5.131,3.389 -5.276,3.36 -5.35,3.36 -5.35,6.56 -5.276,6.56 -5.131,6.531 -4.995,6.475 -4.872,6.393 -4.767,6.288 -4.685,6.165 -4.629,6.029 -4.6,5.884 -4.6,5.81
  region: -6.1,4.11 -6.1,4.036 -6.071,3.891 -6.015,3.755 -5.933,3.632 -5.828,3.527 -5.705,3.445 -5.569,3.389 -5.424,3.36 -5.35,3.36 -5.35,6.56 -5.424,6.56 -5.569,6.531 -5.705,6.475 -5.828,6.393 -5.933,6.288 -6.015,6.165 -6.071,6.029 -6.1,5.884 -6.1,5.81
  region: -4.6,9.51 -4.6,9.584 -4.629,9.729 -4.685,9.865 -4.767,9.988 -4.872,10.093 -4.995,10.175 -5.131,10.231 -5.276,10.26 -5.35,10.26 -5.35,7.06 -5.276,7.06 -5.131,7.089 -4.995,7.145 -4.872,7.227 -4.767,7.332 -4.685,7.455 -4.629,7.591 -4.6,7.736 -4.6,7.81
  region: -6.1,9.51 -6.1,9.584 -6.071,9.729 -6.015,9.865 -5.933,9.988 -5.828,10.093 -5.705,10.175 -5.569,10.231 -5.424,10.26 -5.35,10.26 -5.35,7.06 -5.424,7.06 -5.569,7.089 -5.705,7.145 -5.828,7.227 -5.933,7.332 -6.015,7.455 -6.071,7.591 -6.1,7.736 -6.1,7.81
  region: -8.1,9.51 -8.1,9.584 -8.071,9.729 -8.015,9.865 -7.933,9.988 -7.828,10.093 -7.705,10.175 -7.569,10.231 -7.424,10.26 -7.35,10.26 -7.35,7.06 -7.424,7.06 -7.569,7.089 -7.705,7.145 -7.828,7.227 -7.933,7.332 -8.015,7.455 -8.071,7.591 -8.1,7.736 -8.1,7.81
  region: -6.6,9.51 -6.6,9.584 -6.629,9.729 -6.685,9.865 -6.767,9.988 -6.872,10.093 -6.995,10.175 -7.131,10.231 -7.276,10.26 -7.35,10.26 -7.35,7.06 -7.276,7.06 -7.131,7.089 -6.995,7.145 -6.872,7.227 -6.767,7.332 -6.685,7.455 -6.629,7.591 -6.6,7.736 -6.6,7.81
  region: -6.6,4.11 -6.6,4.036 -6.629,3.891 -6.685,3.755 -6.767,3.632 -6.872,3.527 -6.995,3.445 -7.131,3.389 -7.276,3.36 -7.35,3.36 -7.35,6.56 -7.276,6.56 -7.131,6.531 -6.995,6.475 -6.872,6.393 -6.767,6.288 -6.685,6.165 -6.629,6.029 -6.6,5.884 -6.6,5.81
  region: -11.35,6.81 -10.1,6.81 -10.1,11.975 -10.2,11.971 -10.396,11.937 -10.586,11.875 -10.765,11.787 -10.93,11.675 -11.078,11.54 -11.205,11.387 -11.31,11.217 -11.35,11.126
  region: -8.1,4.11 -8.1,4.036 -8.071,3.891 -8.015,3.755 -7.933,3.632 -7.828,3.527 -7.705,3.445 -7.569,3.389 -7.424,3.36 -7.35,3.36 -7.35,6.56 -7.424,6.56 -7.569,6.531 -7.705,6.475 -7.828,6.393 -7.933,6.288 -8.015,6.165 -8.071,6.029 -8.1,5.884 -8.1,5.81
  region: -10.1,1.645 -9.995,1.645 -9.786,1.675 -9.584,1.733 -9.392,1.819 -9.214,1.931 -9.053,2.067 -8.913,2.224 -8.796,2.399 -8.75,2.494 -8.75,6.57 -8.797,6.575 -8.883,6.61 -8.95,6.677 -8.985,6.763 -8.99,6.81 -10.1,6.81
  region: -11.35,6.81 -10.1,6.81 -10.1,1.645 -10.2,1.649 -10.396,1.683 -10.586,1.745 -10.765,1.833 -10.93,1.945 -11.078,2.08 -11.205,2.233 -11.31,2.403 -11.35,2.494
  region: -10.1,11.975 -9.995,11.975 -9.786,11.945 -9.584,11.887 -9.392,11.801 -9.214,11.689 -9.053,11.553 -8.913,11.396 -8.796,11.221 -8.75,11.126 -8.75,7.05 -8.797,7.045 -8.883,7.01 -8.95,6.943 -8.985,6.857 -8.99,6.81 -10.1,6.81
Top Overlay:
  lines w0.2: -11.85,7.343 -11.85,12.56 cw(c-11.65,12.56) -11.65,12.76 -10.85,12.76 10.85,12.76 11.65,12.76 cw(c11.65,12.56) 11.85,12.56 11.85,7.343 ; -10.85,1.426 -10.85,-0.24 ; 10.85,1.426 10.85,-0.24 ; -10.85,-0.24 cw(c-10.65,-0.24) -10.65,-0.04 10.65,-0.04 cw(c10.65,-0.24) 10.85,-0.24 ; -10.85,-0.24 -10.85,-0.59 ccw(c-10.65,-0.59) -10.65,-0.79 10.65,-0.79 ccw(c10.65,-0.59) 10.85,-0.59 10.85,-0.24
Mechanical 3:
  lines w0.1: -12.2,0 12.2,0
  text "Board Edge" at -12,-0.5 h0.2
Mechanical 13:
  drawing of 189 lines, arcs and shapes, not listed
  text ".Designator" at -2.274,0.297 h2.69
Mechanical 15:
  lines w0.05: -12.45,-15.59 -12.45,12.86 12.45,12.86 12.45,-15.59 -12.45,-15.59
  lines w0.1: -0.5,0 0.5,0 ; 0,-0.5 0,0.5
3D body "d4s21j-40mA5-E.stp": height 11, standoff -3.2, extent -12.35,-15.49 12.35,12.76

## ROS-D4S24D-400A5-C_V [mm] "HSD Right Angle Plug, Edge Mount, 34x15.4x10.6mm, Rosenberger Recommended"
height 10.6
pads (8):
  round 1.45 hole 1.05: 1(-1,7.5) 2(-1,5.5) 3(1,5.5) 4(1,7.5)
  round 2.25 hole 1.75: MH(-4.5,2) MH(-4.5,11) MH(4.5,2) MH(4.5,11)
Top Overlay:
  lines w0.2: -5.5,3.151 -5.5,9.849 ; -3.348,1 3.348,1 ; -3.307,11.95 3.307,11.95 ; 5.5,3.151 5.5,9.849
Mechanical 3:
  lines w0.1: -7.5,0 7.5,0
  text "Board Edge" at -7,-0.5 h0.2
Mechanical 13:
  drawing of 176 lines, arcs and shapes, not listed
  text ".Designator" at -3.036,-7.069 h2.69
Mechanical 15:
  lines w0.05: -7.8,-22.1 -7.8,12.225 7.8,12.225 7.8,-22.1 -7.8,-22.1
  lines w0.1: -0.5,0 0.5,0 ; 0,-0.5 0,0.5
3D body "d4s24d-400A5-C.stp": height 14, standoff -3, extent -7.7,-22 7.7,11.95

## ROS-D4S24D-400A5-D_V [mm] "HSD Right Angle Plug, Edge Mount, 34x15.4x10.6mm, Rosenberger Recommended"
height 10.6
pads (8):
  round 1.45 hole 1.05: 1(-1,7.5) 2(-1,5.5) 3(1,5.5) 4(1,7.5)
  round 2.25 hole 1.75: MH(-4.5,2) MH(-4.5,11) MH(4.5,2) MH(4.5,11)
Top Overlay:
  lines w0.2: -5.5,3.151 -5.5,9.849 ; -3.348,1 3.348,1 ; -3.307,11.95 3.307,11.95 ; 5.5,3.151 5.5,9.849
Mechanical 3:
  lines w0.1: -7,0 7,0
  text "Board Edge" at -7,-0.5 h0.2
Mechanical 13:
  drawing of 176 lines, arcs and shapes, not listed
  text ".Designator" at -2.401,-7.196 h2.69
Mechanical 15:
  lines w0.05: -7.8,-22.1 -7.8,12.225 7.8,12.225 7.8,-22.1 -7.8,-22.1
  lines w0.1: -0.5,0 0.5,0 ; 0,-0.5 0,0.5
3D body "d4s24d-400A5-D.stp": height 14, standoff -3, extent -7.7,-22 7.7,11.95

## ROS-D4S24D-400A5-Z_V [mm] "HSD Right Angle Plug, Edge Mount, 34x15.4x10.6mm, Rosenberger Recommended"
height 10.6
pads (8):
  round 1.45 hole 1.05: 1(-1,7.5) 2(-1,5.5) 3(1,5.5) 4(1,7.5)
  round 2.25 hole 1.75: MH(-4.5,2) MH(-4.5,11) MH(4.5,2) MH(4.5,11)
Top Overlay:
  lines w0.2: -5.5,3.151 -5.5,9.849 ; -3.348,1 3.348,1 ; -3.307,11.95 3.307,11.95 ; 5.5,3.151 5.5,9.849
Mechanical 3:
  lines w0.1: -7.5,0 7.5,0
  text "Board Edge" at -7,-0.5 h0.2
Mechanical 13:
  drawing of 184 lines, arcs and shapes, not listed
  text ".Designator" at -2.401,-7.323 h2.69
Mechanical 15:
  lines w0.05: -7.8,-22.1 7.8,-22.1 7.8,12.225 -7.8,12.225 -7.8,-22.1
  lines w0.1: -0.5,0 0.5,0 ; 0,-0.5 0,0.5
3D body "d4s24d-400A5-Z.stp": height 14, standoff -3, extent -7.7,-22 7.7,11.95